# Altium footprint library TelemetriaGPRS-V3.PcbLib: 48 footprints (part 3 of 3)
Each footprint in its own frame and in the unit in brackets; x right, y up, seen from the top. Pads: shape width x height; smd on the part's side, far side on the other; paste and mask are expansions set on the pad; w line width, h text height; cw(c..) or ccw(c..) is an arc to the next point about the centre after c.
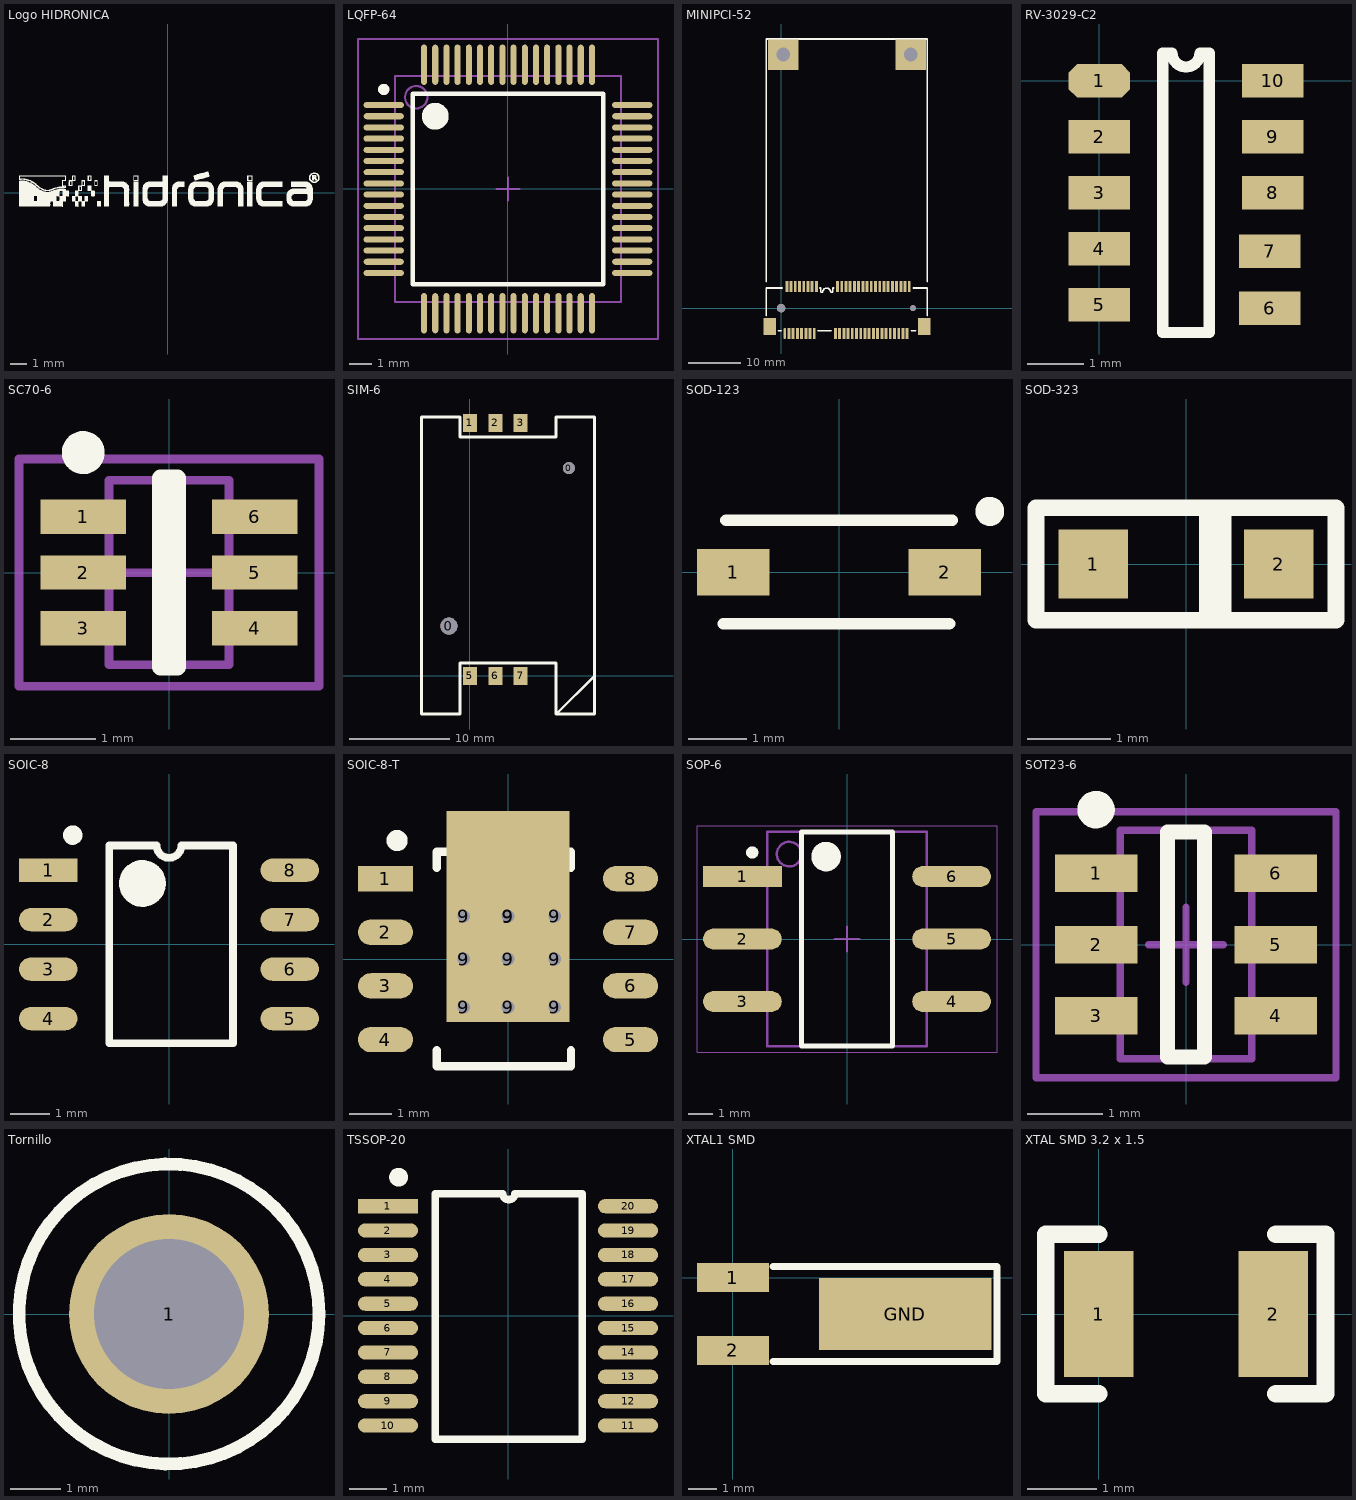
[diagram p2: the footprints below, top view; thin cyan lines are the x and y axes]

## Logo HIDRONICA [mm]
Top Overlay:
  drawing of 1317 lines, arcs and shapes, not listed

## LQFP-64 [mm] "TSQFP, 64-Leads, Body 12.2x12.2mm (max), Pitch 0.50mm, IPC Medium Density"
height 1.6
pads (64):
  oval 1.8x0.27 smd: 1(-5.55,3.75) 2(-5.55,3.25) 3(-5.55,2.75) 4(-5.55,2.25) 5(-5.55,1.75) 6(-5.55,1.25) 7(-5.55,0.75) 8(-5.55,0.25) 9(-5.55,-0.25) 10(-5.55,-0.75) 11(-5.55,-1.25) 12(-5.55,-1.75) 13(-5.55,-2.25) 14(-5.55,-2.75) 15(-5.55,-3.25) 16(-5.55,-3.75) 33(5.55,-3.75) 34(5.55,-3.25) 35(5.55,-2.75) 36(5.55,-2.25) 37(5.55,-1.75) 38(5.55,-1.25) 39(5.55,-0.75) 40(5.55,-0.25) 41(5.55,0.25) 42(5.55,0.75) 43(5.55,1.25) 44(5.55,1.75) 45(5.55,2.25) 46(5.55,2.75) 47(5.55,3.25) 48(5.55,3.75)
  oval 0.27x1.8 smd: 17(-3.75,-5.55) 18(-3.25,-5.55) 19(-2.75,-5.55) 20(-2.25,-5.55) 21(-1.75,-5.55) 22(-1.25,-5.55) 23(-0.75,-5.55) 24(-0.25,-5.55) 25(0.25,-5.55) 26(0.75,-5.55) 27(1.25,-5.55) 28(1.75,-5.55) 29(2.25,-5.55) 30(2.75,-5.55) 31(3.25,-5.55) 32(3.75,-5.55) 49(3.75,5.55) 50(3.25,5.55) 51(2.75,5.55) 52(2.25,5.55) 53(1.75,5.55) 54(1.25,5.55) 55(0.75,5.55) 56(0.25,5.55) 57(-0.25,5.55) 58(-0.75,5.55) 59(-1.25,5.55) 60(-1.75,5.55) 61(-2.25,5.55) 62(-2.75,5.55) 63(-3.25,5.55) 64(-3.75,5.55)
Top Overlay:
  circle w0.25: c-5.55,4.45 r0.125
  circle w0.6: c-3.25,3.25 r0.3
  lines w0.2: -4.25,-4.25 -4.25,4.25 4.25,4.25 4.25,-4.25 -4.25,-4.25
Mechanical 13:
  circle w0.1: c-4.1,4.1 r0.5
  lines w0.1: -5.05,-5.05 -5.05,5.05 5.05,5.05 5.05,-5.05 -5.05,-5.05
Mechanical 15:
  lines w0.1: -0.5,0 0.5,0 ; 0,-0.5 0,0.5 ; -6.7,-6.7 -6.7,6.7 6.7,6.7 6.7,-6.7 -6.7,-6.7
3D body: height 1.5, standoff 0.02, extent -6,-5.945 6,6.055

## MINIPCI-52 [mm]
pads (58):
  oct 0.55x2.1 smd: 1(0.7,-4.8)
  rect 0.55x2.1 smd: 2(1.1,4.1) 3(1.5,-4.8) 4(1.9,4.1) 5(2.3,-4.8) 6(2.7,4.1) 7(3.1,-4.8) 8(3.5,4.1) 9(3.9,-4.8) 10(4.3,4.1) 11(4.7,-4.8) 12(5.1,4.1) 13(5.5,-4.8) 14(5.9,4.1) 15(6.3,-4.8) 16(6.7,4.1) 17(10.3,-4.8) 18(10.7,4.1) 19(11.1,-4.8) 20(11.5,4.1) 21(11.9,-4.8) 22(12.3,4.1) 23(12.7,-4.8) 24(13.1,4.1) 25(13.5,-4.8) 26(13.9,4.1) 27(14.3,-4.8) 28(14.7,4.1) 29(15.1,-4.8) 30(15.5,4.1) 31(15.9,-4.8) 32(16.3,4.1) 33(16.7,-4.8) 34(17.1,4.1) 35(17.5,-4.8) 36(17.9,4.1) 37(18.3,-4.8) 38(18.7,4.1) 39(19.1,-4.8) 40(19.5,4.1) 41(19.9,-4.8) 42(20.3,4.1) 43(20.7,-4.8) 44(21.1,4.1) 45(21.5,-4.8) 46(21.9,4.1) 47(22.3,-4.8) 48(22.7,4.1) 49(23.1,-4.8) 50(23.5,4.1) 51(23.9,-4.8) 52(24.3,4.1)
  rect 2.3x3.2 smd: ""(-2.15,-3.5) ""(27.15,-3.5)
  round 1.6 hole 1.6 unplated: ""(0,0)
  rect 5.8x5.8 hole 2.6: ""(0.4,48.05) ""(24.6,48.05)
  round 1.1 hole 1.1 unplated: ""(25,0)
Top Overlay:
  lines w0.254: 7.888,3.048 cw(c8.65,3.048) 9.412,3.048
  lines w0.3: -2.794,-1.397 -2.794,3.81 0.254,3.81 ; -2.794,5 -2.794,51 27.686,51 27.686,5 ; -0.508,-4.318 0,-4.318 ; 6.985,-4.318 9.525,-4.318 ; 7.366,3.81 7.493,3.81 7.493,3.048 7.888,3.048 ; 9.412,3.048 9.807,3.048 9.807,3.81 9.934,3.81 ; 24.638,-4.318 25.527,-4.318 ; 25.019,3.81 27.686,3.81 27.686,-1.397
3D body: height 4.1, standoff -0.55, extent -2.413,-4.672 27.487,4.418

## RV-3029-C2 [mm]
pads (10):
  oct 1.1x0.6 smd: 1(0,0)
  rect 1.1x0.6 smd: 2(0,-1) 3(0,-2) 4(0,-3) 5(0,-4) 6(3.048,-4.064) 7(3.048,-3.048) 8(3.1,-2) 9(3.1,-1) 10(3.1,0)
Top Overlay:
  lines w0.2: 1.135,-4.5 1.965,-4.5 1.965,0.5 1.8,0.5 cw(c1.55,0.5) 1.3,0.5 1.135,0.5 1.135,-4.5
3D body: height 1.18, standoff -0.02, extent 0,-4.5 3.2,0.5

## SC70-6 [mm] "6-Leads, Body 2.2x2.5mm (max), Pitch 0.65mm, IPC Medium Density"
height 1.1
pads (6):
  rect 1x0.4 smd: 1(-1,0.65) 2(-1,0) 3(-1,-0.65) 4(1,-0.65) 5(1,0) 6(1,0.65)
Top Overlay:
  circle w0.25: c-1,1.4 r0.125
  lines w0.2: -0.1,-1.1 0.1,-1.1 0.1,1.1 -0.1,1.1 -0.1,-1.1
Mechanical 13:
  lines w0.1: -0.7,-1.075 -0.7,1.075 0.7,1.075 0.7,-1.075 -0.7,-1.075
Mechanical 15:
  lines w0.1: -0.5,0 0.5,0 ; 0,-0.5 0,0.5 ; -1.75,-1.325 -1.75,1.325 1.75,1.325 1.75,-1.325 -1.75,-1.325
3D body: height 1.1, standoff 0, extent -1.2,-1.1 1.2,1.1

## SIM-6 [mm]
pads (8):
  round 1.7 hole 1.7: 0(-2.1,4.98)
  round 1.2 hole 1.2: 0(9.9,20.78)
  rect 1.4x1.8 smd: 1(0,25.3) 2(2.54,25.3) 3(5.08,25.3) 5(0,0) 6(2.54,0) 7(5.08,0)
Top Overlay:
  lines w0.254: 8.763,-3.81 8.636,-3.81 12.446,0
  lines w0.3: -4.826,-3.81 -4.826,25.908 -1.016,25.908 -1.016,23.876 8.636,23.876 8.636,25.908 12.446,25.908 12.446,-3.81 8.636,-3.81 8.636,1.27 -1.016,1.27 -1.016,-3.81 -4.826,-3.81
3D body: height 2.35, standoff -0.7, extent -4.79,-3.801 12.41,25.899

## SOD-123 [mm]
height 1.35
pads (2):
  rect 1.25x0.8 smd: 1(-1.825,0) 2(1.825,0)
Top Overlay:
  circle w0.25: c2.6,1.05 r0.125
  lines w0.2: -1.995,-0.889 1.905,-0.889 ; -1.95,0.9 1.95,0.9
3D body: height 1.42, standoff -0.03, extent -1.937,-0.938 1.913,0.762

## SOD-323 [mm]
pads (2):
  rect 0.83x0.83 smd: 1(-1.112,0) 2(1.112,0)
Top Overlay:
  lines w0.2: 0.254,-0.635 0.254,0.651 ; 0.445,-0.635 0.445,0.651 ; -1.8,-0.675 -1.8,0.675 1.8,0.675 1.8,-0.675 -1.8,-0.675
3D body: height 1.1, standoff 0, extent -1.3,-0.675 1.3,0.675

## SOIC-8 [mm]
pads (8):
  rect 1.5x0.6 smd: 1(-3.1,1.905)
  oval 1.5x0.6 smd: 2(-3.1,0.635) 3(-3.1,-0.635) 4(-3.1,-1.905) 5(3.1,-1.905) 6(3.1,-0.635) 7(3.1,0.635) 8(3.1,1.905)
Top Overlay:
  circle w0.6: c-0.682,1.563 r0.3
  circle w0.25: c-2.472,2.805 r0.125
  lines w0.2: -1.532,-2.54 -1.532,2.54 -0.318,2.54 ccw(c0,2.54) 0.317,2.54 1.643,2.54 1.643,-2.54 -1.532,-2.54
3D body: height 1.7, standoff 0, extent -3,-2.45 3,2.45

## SOIC-8-T [mm]
pads (18):
  rect 1.3x0.6 smd: 1(-2.9,1.905)
  oval 1.3x0.6 smd: 2(-2.9,0.635) 3(-2.9,-0.635) 4(-2.9,-1.905) 5(2.9,-1.905) 6(2.9,-0.635) 7(2.9,0.635) 8(2.9,1.905)
  round 0.6 hole 0.3: 9(-1.049,-1.143) 9(-1.049,0) 9(-1.049,1.016) 9(0,-1.143) 9(0,0) 9(0,1.016) 9(1.11,-1.143) 9(1.11,0) 9(1.11,1.016)
  rect 2.9x5 smd: 9(0,1.005)
Top Overlay:
  circle w0.25: c-2.624,2.805 r0.125
  lines w0.2: -1.684,-2.159 -1.684,-2.54 1.491,-2.54 1.491,-2.159 ; -1.684,2.159 -1.684,2.54 -0.47,2.54 ccw(c-0.153,2.54) 0.165,2.54 1.491,2.54 1.491,2.159
3D body: height 1.7, standoff 0, extent -3.16,-2.45 2.84,2.45

## SOP-6 [mm] "SOP, 6-Leads, Body 8.55x6.40mm, Pitch 2.54mm, IPC Medium Density"
height 4.7
pads (6):
  rect 3.2x0.85 smd: 1(-4.25,2.54)
  oval 3.2x0.85 smd: 2(-4.25,0) 3(-4.25,-2.54) 4(4.25,-2.54) 5(4.25,0) 6(4.25,2.54)
Top Overlay:
  circle w0.25: c-3.85,3.515 r0.125
  circle w0.6: c-0.85,3.35 r0.3
  lines w0.2: -1.85,-4.35 -1.85,4.35 1.85,4.35 1.85,-4.35 -1.85,-4.35
Mechanical 13:
  circle w0.1: c-2.35,3.45 r0.5
  lines w0.1: -3.25,-4.35 -3.25,4.35 3.25,4.35 3.25,-4.35 -3.25,-4.35
Mechanical 15:
  lines w0.05: -6.096,-4.6 -6.096,4.6 6.096,4.6 6.096,-4.6 -6.096,-4.6
  lines w0.1: -0.5,0 0.5,0 ; 0,-0.5 0,0.5
3D body: height 4.1, standoff 0.02, extent -4.508,-4.255 4.657,4.255

## SOT23-6 [mm]
height 1.45
pads (6):
  rect 1.1x0.5 smd: 1(-1.2,0.95) 2(-1.2,0) 3(-1.2,-0.95) 4(1.2,-0.95) 5(1.2,0) 6(1.2,0.95)
Top Overlay:
  circle w0.25: c-1.2,1.8 r0.125
  lines w0.2: -0.25,-1.5 0.25,-1.5 0.25,1.5 -0.25,1.5 -0.25,-1.5
Mechanical 13:
  lines w0.1: -0.875,-1.525 -0.875,1.525 0.875,1.525 0.875,-1.525 -0.875,-1.525
Mechanical 15:
  lines w0.1: -0.5,0 0.5,0 ; 0,-0.5 0,0.5 ; -2,-1.775 -2,1.775 2,1.775 2,-1.775 -2,-1.775
3D body: height 0.86, standoff 0, extent -1.405,-1.5 1.405,1.5

## Tornillo [mm]
pads (1):
  round 4 hole 3 unplated: 1(0,0)
Top Overlay:
  circle w0.254: c0,0 r3
Bottom Overlay:
  circle w0.254: c0,0 r3
3D body: height 2.01, standoff -7.62, extent -2.667,-2.667 2.667,2.667

## TSSOP-20 [mm]
height 0.55
pads (20):
  rect 1.6x0.38 smd: 1(-3.2,2.925)
  oval 1.6x0.38 smd: 2(-3.2,2.275) 3(-3.2,1.625) 4(-3.2,0.975) 5(-3.2,0.325) 6(-3.2,-0.325) 7(-3.2,-0.975) 8(-3.2,-1.625) 9(-3.2,-2.275) 10(-3.2,-2.925) 11(3.2,-2.925) 12(3.2,-2.275) 13(3.2,-1.625) 14(3.2,-0.975) 15(3.2,-0.325) 16(3.2,0.325) 17(3.2,0.975) 18(3.2,1.625) 19(3.2,2.275) 20(3.2,2.925)
Top Overlay:
  circle w0.25: c-2.919,3.698 r0.125
  lines w0.2: -1.944,-3.287 1.986,-3.287 1.986,3.261 0.183,3.261 cw(c0.021,3.261) -0.142,3.261 -1.944,3.261 -1.944,-3.287
3D body: height 1.2, standoff 0, extent -3.275,-3.3 3.275,3.3

## XTAL1 SMD [mm]
pads (3):
  rect 2.5x1 smd: 1(0,0) 2(0,-2.54)
  rect 6x2.5 smd: GND(6,-1.27)
Top Overlay:
  lines w0.254: 1.397,-2.921 9.2,-2.921 9.2,0.381 1.397,0.381
3D body: height 2, standoff 0, extent -0.69,-2.673 8.31,0.127

## XTAL SMD 3.2 x 1.5 [mm] "XTAL SMD 32.768 KHz 3.2 x 1.5 x 0.9 mm"
pads (2):
  rect 1x1.8 smd: 1(0,0) 2(2.5,0)
Top Overlay:
  lines w0.254: 0,-1.143 -0.762,-1.143 -0.762,1.143 0,1.143 ; 2.54,-1.143 3.25,-1.143 3.25,1.143 2.54,1.143